# Altium footprint library Selex_PCBLib.PcbLib: 388 footprints (part 20 of 25)
Each footprint in its own frame and in the unit in brackets; x right, y up, seen from the top. Pads: shape width x height; smd on the part's side, far side on the other; paste and mask are expansions set on the pad; w line width, h text height; cw(c..) or ccw(c..) is an arc to the next point about the centre after c.
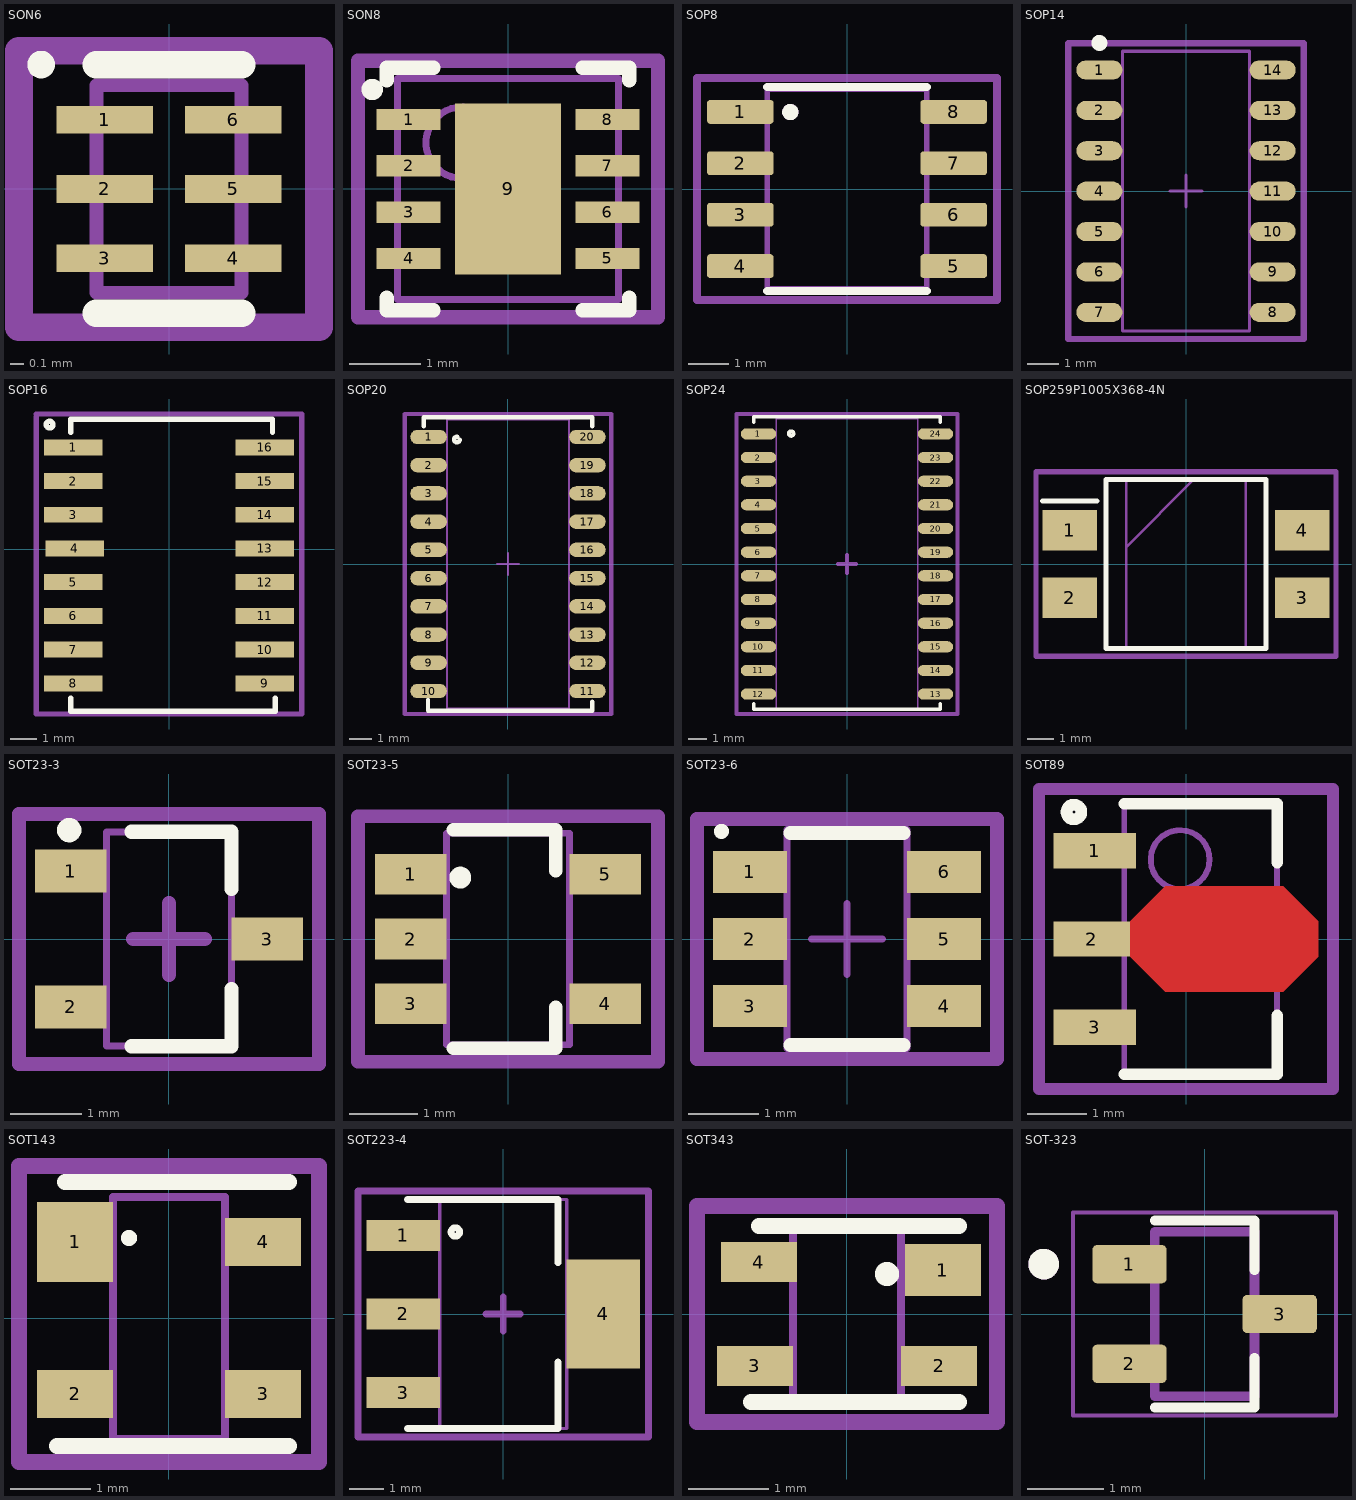
[diagram p19: the footprints below, top view; thin cyan lines are the x and y axes]

## SON6 [mm] "SON_6_0P5_3P0"
pads (6):
  rect 0.7x0.2 smd: 1(-0.465,0.5) 2(-0.465,0) 3(-0.465,-0.5) 4(0.465,-0.5) 5(0.465,0) 6(0.465,0.5)
Top Overlay:
  circle w0.1: c-0.925,0.9 r0.05
  lines w0.2: -0.525,-0.9 0.525,-0.9 ; -0.525,0.9 0.525,0.9
Mechanical 13:
  lines w0.1: -0.525,-0.75 -0.525,0.75 0.525,0.75 0.525,-0.75 -0.525,-0.75
Mechanical 15:
  lines w0.2: -1.085,-1 -1.085,1 1.085,1 1.085,-1 -1.085,-1
3D body "User Library-SON6C.STEP": height 0.55, standoff -0.05, extent -1,-0.8 1,0.8

## SON8 [mm] "SON_8_0P65_2P8"
pads (9):
  rect 0.9x0.3 smd: 1(-1.395,0.975) 2(-1.395,0.325) 3(-1.395,-0.325) 4(-1.395,-0.975) 5(1.395,-0.975) 6(1.395,-0.325) 7(1.395,0.325) 8(1.395,0.975)
  rect 1.49x2.4 smd: 9(0,0)
Top Overlay:
  circle w0.2: c-1.905,1.397 r0.05
  lines w0.2: -1.7,-1.525 -1.7,-1.7 -1.045,-1.7 ; -1.7,1.525 -1.7,1.7 -1.045,1.7 ; 1.045,-1.7 1.7,-1.7 1.7,-1.525 ; 1.045,1.7 1.7,1.7 1.7,1.525
Mechanical 13:
  circle w0.1: c-0.65,0.65 r0.5
  lines w0.1: -1.55,-1.55 -1.55,1.55 1.55,1.55 1.55,-1.55 -1.55,-1.55
Mechanical 15:
  lines w0.2: -2.105,-1.8 -2.105,1.8 2.105,1.8 2.105,-1.8 -2.105,-1.8
3D body "User Library-SON8_3mm.STEP": height 1, standoff 0, extent -1.575,-1.575 1.575,1.575

## SOP8 [mm] "SOP_8_1P27_5P2"
pads (8):
  rrect25% 1.64x0.59 smd: 1(-2.635,1.905) 2(-2.635,0.635) 3(-2.635,-0.635) 4(-2.635,-1.905) 5(2.635,-1.905) 6(2.635,-0.635) 7(2.635,0.635) 8(2.635,1.905)
Top Overlay:
  circle w0.2: c-1.4,1.9 r0.1
  lines w0.2: -1.97,-2.52 1.97,-2.52 ; -1.97,2.52 1.97,2.52
Mechanical 13:
  circle w0.2: c-1.4,1.9 r0.1
  lines w0.127: -1.97,-2.465 1.97,-2.465 1.97,2.465 -1.97,2.465 -1.97,-2.465
Mechanical 15:
  lines w0.2: -3.705,-2.74 3.705,-2.74 3.705,2.74 -3.705,2.74 -3.705,-2.74
3D body "TPS5430DDAR.stp": height 1.57, standoff 0, extent -3.014,-2.45 3.014,2.45

## SOP14 [mm] "SOP, 14-Leads, Body 8.65x3.90mm, Pitch 1.27mm, IPC Medium Density"
height 1.75
pads (14):
  oval 1.45x0.6 smd: 1(-2.725,3.81) 2(-2.725,2.54) 3(-2.725,1.27) 4(-2.725,0) 5(-2.725,-1.27) 6(-2.725,-2.54) 7(-2.725,-3.81) 8(2.725,-3.81) 9(2.725,-2.54) 10(2.725,-1.27) 11(2.725,0) 12(2.725,1.27) 13(2.725,2.54) 14(2.725,3.81)
Top Overlay:
  circle w0.25: c-2.725,4.66 r0.125
Mechanical 13:
  lines w0.1: -2,-4.4 -2,4.4 2,4.4 2,-4.4 -2,-4.4
Mechanical 15:
  lines w0.1: -0.5,0 0.5,0 ; 0,-0.5 0,0.5
  lines w0.2: -3.7,-4.65 -3.7,4.65 3.7,4.65 3.7,-4.65 -3.7,-4.65
3D body "User Library-SOP14.STEP": height 1.39, standoff 0, extent -3.119,-4.375 3.119,4.375

## SOP16 [mm] "SOP_16_1p27x7p2"
pads (16):
  rect 2.2x0.6 smd: 1(-3.6,3.845) 2(-3.6,2.575) 3(-3.6,1.305) 4(-3.556,0.035) 5(-3.6,-1.235) 6(-3.6,-2.505) 7(-3.6,-3.775) 8(-3.6,-5.045) 9(3.6,-5.045) 10(3.6,-3.775) 11(3.6,-2.505) 12(3.6,-1.235) 13(3.6,0.035) 14(3.6,1.305) 15(3.6,2.575) 16(3.6,3.845)
Top Overlay:
  circle w0.2: c-4.5,4.7 r0.125
  lines w0.2: -3.7,-5.6 -3.7,-6.1 4,-6.1 4,-5.6 ; -3.7,4.4 -3.7,4.9 3.9,4.9 3.9,4.4
Mechanical 15:
  lines w0.2: -5,5 -5,-6.2 5,-6.2 5,5.1 -5,5.1
3D body "SOP-16.STEP": height 2.1, standoff 0, extent -3.6,-5.75 3.4,4.55

## SOP20 [mm] "SOP_20_1P27_7P24"
pads (20):
  oval 1.65x0.65 smd: 1(-3.575,5.715) 2(-3.575,4.445) 3(-3.575,3.175) 4(-3.575,1.905) 5(-3.575,0.635) 6(-3.575,-0.635) 7(-3.575,-1.905) 8(-3.575,-3.175) 9(-3.575,-4.445) 10(-3.575,-5.715) 11(3.575,-5.715) 12(3.575,-4.445) 13(3.575,-3.175) 14(3.575,-1.905) 15(3.575,-0.635) 16(3.575,0.635) 17(3.575,1.905) 18(3.575,3.175) 19(3.575,4.445) 20(3.575,5.715)
Top Overlay:
  lines w0.2: -3.8,6.2 -3.8,6.6 3.8,6.6 3.8,6.2 ; -3.6,-6.1 -3.6,-6.6 3.8,-6.6 3.8,-6.2 ; -2.288,5.724 ccw(c-2.3,5.6) -2.175,5.6
Mechanical 13:
  lines w0.1: -2.75,-6.5 -2.75,6.5 2.75,6.5 2.75,-6.5 -2.75,-6.5
Mechanical 15:
  lines w0.1: -0.5,0 0.5,0 ; 0,-0.5 0,0.5
  lines w0.2: -4.65,-6.75 -4.65,6.75 4.65,6.75 4.65,-6.75 -4.65,-6.75
3D body "User Library-SOP20.STEP": height 2, standoff 0, extent -4.05,-6.35 4.05,6.35

## SOP24 [mm] "SOP_24_1P27_9P5"
pads (24):
  oval 1.9x0.6 smd: 1(-4.75,6.985) 2(-4.75,5.715) 3(-4.75,4.445) 4(-4.75,3.175) 5(-4.75,1.905) 6(-4.75,0.635) 7(-4.75,-0.635) 8(-4.75,-1.905) 9(-4.75,-3.175) 10(-4.75,-4.445) 11(-4.75,-5.715) 12(-4.75,-6.985) 13(4.75,-6.985) 14(4.75,-5.715) 15(4.75,-4.445) 16(4.75,-3.175) 17(4.75,-1.905) 18(4.75,-0.635) 19(4.75,0.635) 20(4.75,1.905) 21(4.75,3.175) 22(4.75,4.445) 23(4.75,5.715) 24(4.75,6.985)
Top Overlay:
  circle w0.2: c-3,7 r0.125
  lines w0.2: -5,-7.5 -5,-7.8 5,-7.8 5,-7.5 ; -5,7.6 -5,7.9 5,7.9 5,7.6
Mechanical 13:
  lines w0.1: -3.8,-7.8 -3.8,7.8 3.8,7.8 3.8,-7.8 -3.8,-7.8
Mechanical 15:
  lines w0.2: -0.5,0 0.5,0 ; 0,-0.5 0,0.5 ; -5.925,-8.05 -5.925,8.05 5.925,8.05 5.925,-8.05 -5.925,-8.05
3D body "User Library-sop-24_asm.STEP": height 1.85, standoff -0.02, extent -5.207,-7.848 5.258,7.849

## SOP259P1005X368-4N [mm]
pads (4):
  rect 2.1x1.55 smd: 1(-4.475,1.295) 2(-4.475,-1.295) 3(4.475,-1.295) 4(4.475,1.295)
Top Overlay:
  lines w0.2: -5.525,2.42 -3.425,2.42 ; -3.075,-3.25 -3.075,3.25 3.075,3.25 3.075,-3.25 -3.075,-3.25
Mechanical 13:
  lines w0.1: -2.3,0.66 0.29,3.25 ; -2.3,-3.25 -2.3,3.25 2.3,3.25 2.3,-3.25 -2.3,-3.25
Mechanical 15:
  lines w0.2: -5.775,-3.55 -5.775,3.55 5.775,3.55 5.775,-3.55 -5.775,-3.55
3D body "TPC817S1D_RAG.stp": height 3.88, standoff 0, extent -5.15,-2.35 5.15,2.35

## SOT23-3 [mm]
pads (3):
  rect 1x0.6 smd: 1(-1.375,0.95) 2(-1.375,-0.95) 3(1.375,0)
Top Overlay:
  circle w0.2: c-1.397,1.524 r0.07
  lines w0.2: -0.525,-1.5 0.875,-1.5 0.875,-0.7 ; -0.525,1.5 0.875,1.5 0.875,0.7
Mechanical 13:
  lines w0.1: -0.875,-1.5 0.875,-1.5 0.875,1.5 -0.875,1.5 -0.875,-1.5
Mechanical 15:
  lines w0.2: -0.5,0 0.5,0 ; 0,-0.5 0,0.5 ; -2.1,-1.75 2.1,-1.75 2.1,1.75 -2.1,1.75 -2.1,-1.75
3D body "SW3DPS-SOT-23-DEFAULT.STEP": height 1.06, standoff -0.04, extent -1.25,-1.5 1.25,1.5

## SOT23-5 [mm] "SOT23-5_0p95x2p8"
pads (5):
  rect 1.05x0.6 smd: 1(-1.425,0.95) 2(-1.425,0) 3(-1.425,-0.95) 4(1.425,-0.95) 5(1.425,0.95)
Top Overlay:
  circle w0.2: c-0.7,0.9 r0.06
  lines w0.2: -0.8,-1.6 0.7,-1.6 0.7,-1 ; -0.8,1.6 0.7,1.6 0.7,1
Mechanical 13:
  lines w0.1: -0.9,-1.55 0.9,-1.55 0.9,1.55 -0.9,1.55 -0.9,-1.55
Mechanical 15:
  lines w0.2: -2.2,-1.8 2.2,-1.8 2.2,1.8 -2.2,1.8 -2.2,-1.8
3D body "SOT23-5.stp": height 1.2, standoff 0.02, extent -1.418,-1.5 1.418,1.5

## SOT23-6 [mm] "SOT23-6 _0P95X2P8"
pads (6):
  rect 1.05x0.6 smd: 1(-1.375,0.95) 2(-1.375,0) 3(-1.375,-0.95) 4(1.375,-0.95) 5(1.375,0) 6(1.375,0.95)
Top Overlay:
  circle w0.2: c-1.778,1.524 r0.005
  lines w0.2: -0.8,-1.5 0.8,-1.5 ; -0.8,1.5 0.8,1.5
Mechanical 13:
  lines w0.1: -0.85,-1.55 -0.85,1.55 0.85,1.55 0.85,-1.55 -0.85,-1.55
Mechanical 15:
  lines w0.1: -0.5,0 0.5,0 ; 0,-0.5 0,0.5
  lines w0.2: -2.125,-1.7 -2.125,1.7 2.125,1.7 2.125,-1.7 -2.125,-1.7
3D body: height 1.4, standoff 0.01, extent -0.85,-1.55 0.85,1.55
3D body "User Library-ZXTC2045E6TA.STEP": height 1.4, standoff 0, extent -1.5,-1.55 1.5,1.55

## SOT89 [mm]
pads (3):
  rect 1.4x0.6 smd: 1(-1.55,1.5) 3(-1.55,-1.5)
  rect 1.3x0.6 smd: 2(-1.6,0)
Top Layer:
  region: -0.95,0.3 -0.35,0.9 1.65,0.9 2.25,0.3 2.25,-0.3 1.65,-0.9 -0.35,-0.9 -0.95,-0.3
Top Overlay:
  circle w0.2: c-1.905,2.159 r0.125
  lines w0.2: -1.05,-2.3 1.55,-2.3 1.55,-1.3 ; -1.05,2.3 1.55,2.3 1.55,1.3
Mechanical 13:
  circle w0.1: c-0.1,1.35 r0.5
  lines w0.1: -1.05,-2.3 -1.05,2.3 1.55,2.3 1.55,-2.3 -1.05,-2.3
Mechanical 15:
  lines w0.2: -2.5,-2.55 -2.5,2.55 2.5,2.55 2.5,-2.55 -2.5,-2.55
3D body "CircuitWorks-SOT89.step": height 1.5, standoff 0, extent -2.1,-2.25 1.9,2.25

## SOT143 [mm]
pads (4):
  rect 0.95x1 smd: 1(-1.175,0.95)
  rect 0.95x0.6 smd: 2(-1.175,-0.95) 3(1.175,-0.95) 4(1.175,0.95)
Top Overlay:
  circle w0.1: c-0.5,1 r0.05
  lines w0.2: -1.4,-1.6 1.5,-1.6 ; -1.3,1.7 1.5,1.7
Mechanical 13:
  lines w0.1: -0.7,-1.51 0.7,-1.51 0.7,1.51 -0.7,1.51 -0.7,-1.51
Mechanical 15:
  lines w0.2: -1.875,-1.8 1.875,-1.8 1.875,1.9 -1.875,1.9 -1.875,-1.8
3D body "Assem1.STEP": height 1.02, standoff -0.02, extent -1.1,-1.5 1.138,1.5

## SOT223-4 [mm]
pads (4):
  rect 2.15x0.9 smd: 1(-2.93,2.3) 2(-2.93,0) 3(-2.93,-2.3)
  rect 2.15x3.2 smd: 4(2.93,0)
Top Overlay:
  circle w0.2: c-1.4,2.4 r0.125
  lines w0.2: -2.805,3.35 1.6,3.35 1.6,1.5 ; -2.8,-3.35 1.6,-3.35 1.6,-1.4
Mechanical 13:
  lines w0.1: -1.855,-3.35 -1.855,3.35 1.855,3.35 1.855,-3.35 -1.855,-3.35
Mechanical 15:
  lines w0.2: -0.5,0 0.5,0 ; 0,-0.5 0,0.5 ; -4.25,-3.6 -4.25,3.6 4.25,3.6 4.25,-3.6 -4.25,-3.6
3D body "SOT230P700X180-4N.step": height 1.8, standoff 0, extent -3.4,-3.35 3.6,3.35

## SOT343 [mm]
pads (4):
  rect 0.95x0.65 smd: 1(1.2,0.55)
  rect 0.95x0.5 smd: 2(1.15,-0.65) 3(-1.15,-0.65) 4(-1.1,0.65)
Top Overlay:
  circle w0.2: c0.5,0.5 r0.05
  lines w0.2: -1.2,-1.1 1.4,-1.1 ; -1.1,1.1 1.4,1.1
Mechanical 13:
  lines w0.1: -0.675,-1.1 -0.675,1.1 0.675,1.1 0.675,-1.1 -0.675,-1.1
Mechanical 15:
  lines w0.2: -1.875,-1.35 -1.875,1.35 1.875,1.35 1.875,-1.35 -1.875,-1.35
3D body "User Library-SOT343-1.STEP": height 1, standoff 0, extent -1.1,-1.1 1.1,1.1

## SOT-323 [mm]
pads (3):
  rrect25% 0.97x0.5 smd: 1(-0.98,0.65) 2(-0.98,-0.65) 3(0.98,0)
Top Overlay:
  circle w0.2: c-2.1,0.65 r0.1
  lines w0.127: -0.65,-1.22 0.65,-1.22 0.65,-0.57 ; -0.65,1.22 0.65,1.22 0.65,0.57
Mechanical 13:
  circle w0.2: c-2.1,0.65 r0.1
  lines w0.127: -0.65,-1.075 0.65,-1.075 0.65,1.075 -0.65,1.075 -0.65,-1.075
Mechanical 15:
  lines w0.05: -1.715,-1.325 -1.715,1.325 1.715,1.325 1.715,-1.325 -1.715,-1.325
3D body "step_temp.STEP": height 1.11, standoff 0.01, extent -1.05,-1 1.05,1